# Altium footprint library LUMI_Handy_Soldering_LIB.PcbLib: 562 footprints (part 4 of 36)
Each footprint in its own frame and in the unit in brackets; x right, y up, seen from the top. Pads: shape width x height; smd on the part's side, far side on the other; paste and mask are expansions set on the pad; w line width, h text height; cw(c..) or ccw(c..) is an arc to the next point about the centre after c.
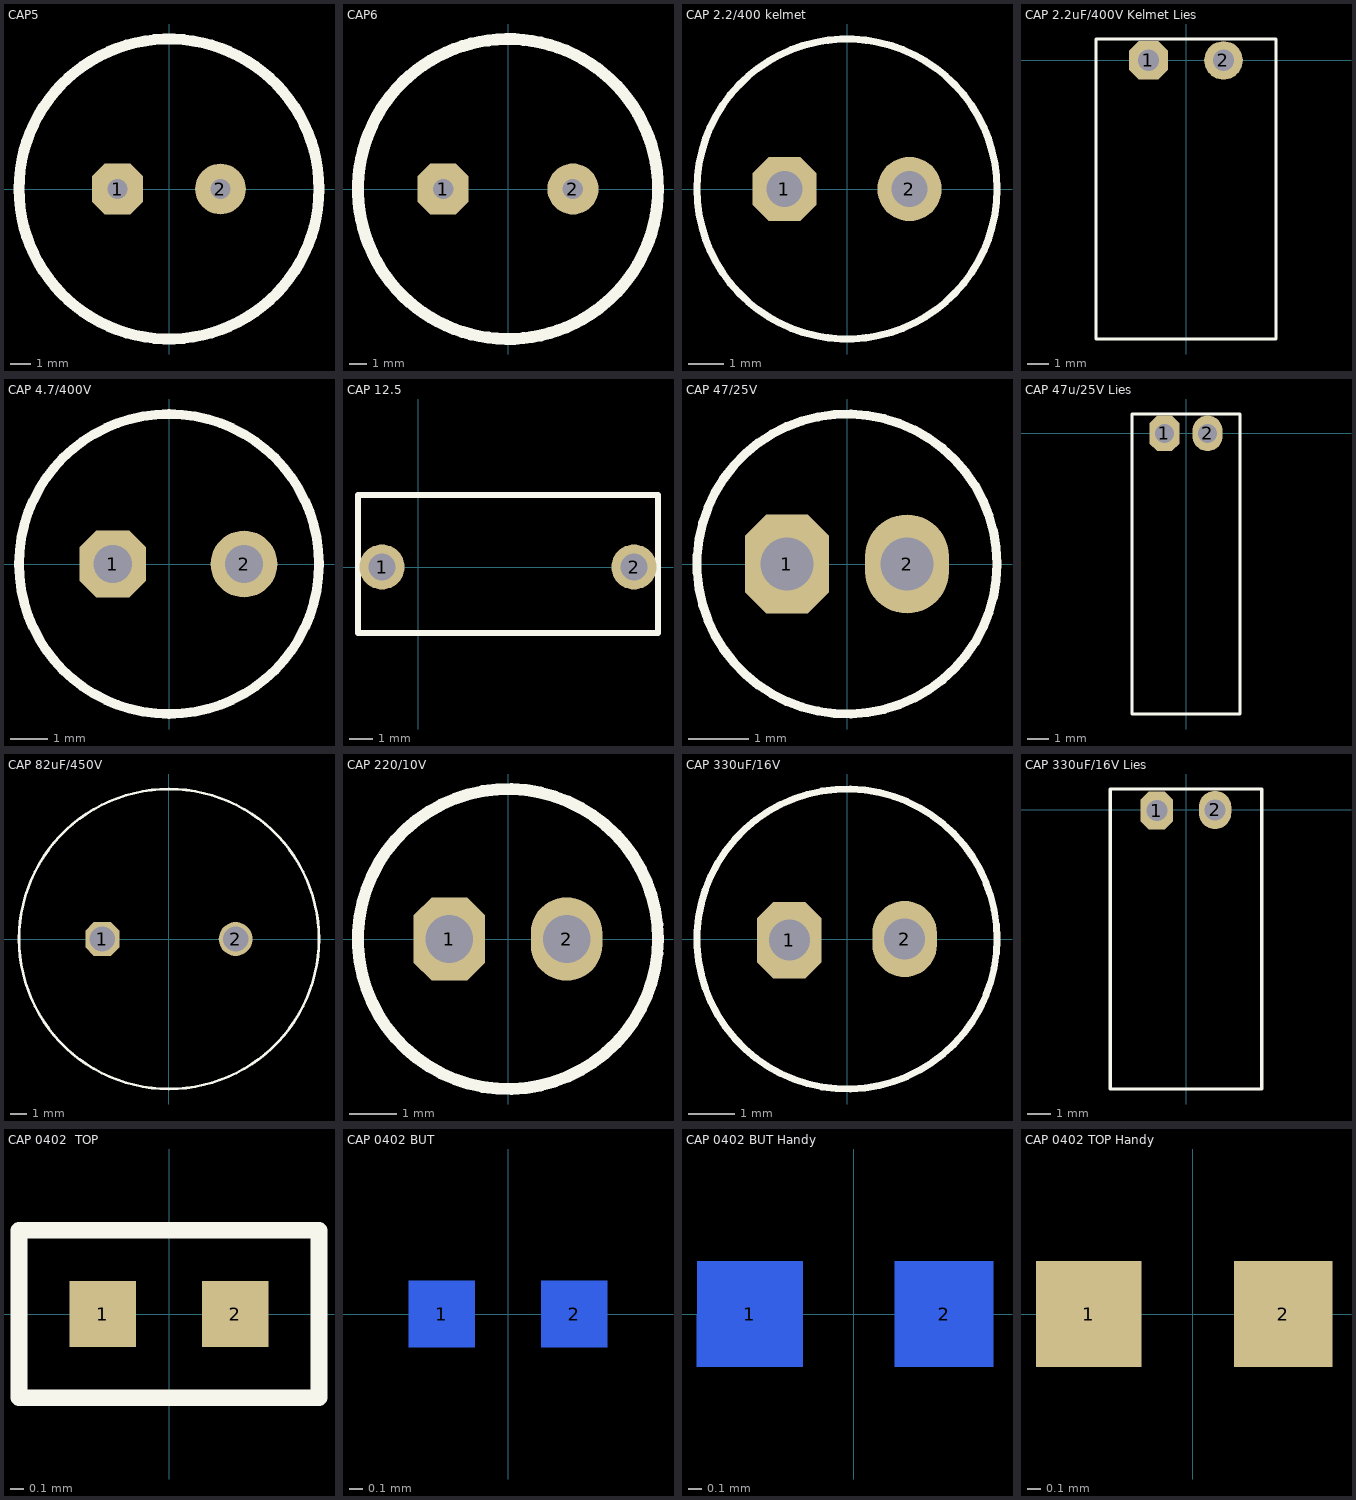
[diagram p3: the footprints below, top view; thin cyan lines are the x and y axes]

## CAP5 [mm]
pads (2):
  oct 2.5x2.5 hole 1: 1(-2.54,0)
  round 2.5 hole 1: 2(2.54,0)
Top Overlay:
  circle w0.54: c0,0 r7.4

## CAP6 [mm]
pads (2):
  oct 3x3 hole 1.2: 1(-3.81,0)
  round 3 hole 1.2: 2(3.81,0)
Top Overlay:
  circle w0.7: c0,0 r8.8

## CAP 2.2/400 kelmet [mm]
pads (2):
  oct 1.8x1.8 hole 1: 1(-1.75,0)
  round 1.8 hole 1: 2(1.75,0)
Top Overlay:
  circle w0.2: c0,0 r4.2
3D body: height 12.13, standoff -2.37, extent -3.996,-4 4.004,4

## CAP 2.2uF/400V Kelmet Lies [mm]
pads (2):
  oct 1.8x1.8 hole 1: 1(-1.75,0)
  round 1.8 hole 1: 2(1.75,0)
Top Overlay:
  lines w0.15: -4.2,-13 -4.2,1 4.2,1 4.2,-13 -4.2,-13
3D body: height 8, standoff 0, extent -4,-13.027 4,1.473

## CAP 4.7/400V [mil]
pads (2):
  oct 70x70 hole 40: 1(-59.06,0)
  round 70 hole 40: 2(78.74,0)
Top Overlay:
  circle w10: c0,0 r157.48
3D body: height 454.24, standoff -746.06, extent -157.48,-157.48 157.48,157.48

## CAP 12.5 [mil]
pads (2):
  round 75 hole 45: 1(-60,0) 2(360,0)
Top Overlay:
  lines w10: -100,-110 400,-110 400,120 -100,120 -100,-110
3D body: height 439.21, standoff -364.35, extent -96.06,-112.28 396.06,120

## CAP 47/25V [mil]
pads (2):
  oct 55x65 hole 35: 1(-39.37,0)
  oval 55x65 hole 35: 2(39.37,0)
Top Overlay:
  circle w5.91: c0,0 r98.43
3D body: height 29.82, standoff -471.19, extent -101.4,-102.04 103.54,100.48

## CAP 47u/25V Lies [mil]
pads (2):
  oct 55x65 hole 35: 1(-39.37,0)
  oval 55x65 hole 35: 2(39.37,0)
Top Overlay:
  lines w5.91: -98.43,-511.81 -98.43,35.43 98.43,35.43 98.43,-511.81 -98.43,-511.81
3D body: height -17.06, standoff -219.57, extent -102.58,-510.34 102.36,-9.34

## CAP 82uF/450V [mil]
pads (2):
  oct 80x80 hole 60: 1(-157.48,0)
  round 80 hole 60: 2(157.48,0)
Top Overlay:
  circle w6.06: c0,0 r354.33
3D body: height 1183.07, standoff -118.11, extent -356.29,-354.32 353.13,354.34

## CAP 220/10V [mil]
pads (2):
  oct 60x70 hole 40: 1(-49.21,0)
  oval 60x70 hole 40: 2(49.21,0)
Top Overlay:
  circle w10: c0,0 r125.98
3D body: height 437.01, standoff -744.09, extent -125.98,-125.98 122.05,122.05

## CAP 330uF/16V [mil]
pads (2):
  oct 55x65 hole 35: 1(-49.21,-0.99)
  oval 55x65 hole 35: 2(49.21,0)
Top Overlay:
  circle w5.91: c0,0 r127.95
3D body: height 29.82, standoff -471.19, extent -101.4,-102.04 103.54,100.48

## CAP 330uF/16V Lies [mil]
pads (2):
  oct 55x65 hole 35: 1(-49.21,-0.99)
  oval 55x65 hole 35: 2(49.21,0)
Top Overlay:
  lines w5.91: -127.95,-472.44 127.95,-472.44 127.95,35.43 -127.95,35.43 -127.95,-472.44
3D body: height -17.06, standoff -219.57, extent -102.58,-470.97 102.36,30.03
3D body: height 235.99, standoff 0.23, extent -117.18,-472.44 118.11,0

## CAP 0402  TOP [mm]
pads (2):
  rect 0.5x0.5 smd: 1(-0.5,0) 2(0.5,0)
Top Overlay:
  lines w0.127: -1.131,-0.631 -1.131,0.25 -1.131,0.631 1.131,0.631 1.131,0.25 1.131,-0.25 1.131,-0.631 -0.75,-0.631 -1.131,-0.631
3D body: height 0.2, standoff 0, extent -0.55,-0.3 0.45,0.3

## CAP 0402 BUT [mm]
pads (2):
  rect 0.5x0.5 smd far side: 1(-0.5,0) 2(0.5,0)
Bottom Overlay:
  lines w0.127: -1.131,-0.631 -1.131,-0.25 -1.131,0.25 -1.131,0.631 1.131,0.631 1.131,0.25 1.131,-0.631 0.75,-0.631 -1.131,-0.631
3D body: height 0.2, standoff 0, extent -0.45,-0.3 0.55,0.3

## CAP 0402 BUT Handy [mil]
pads (2):
  rect 30x30 smd far side: 1(-29.53,0)
  rect 28x30 smd far side: 2(25.59,0)
3D body: height -16.5, standoff -48, extent -33.46,-15.74 29.54,15.75

## CAP 0402 TOP Handy [mil]
pads (2):
  rect 30x30 smd: 1(-29.53,0)
  rect 28x30 smd: 2(25.59,0)
3D body: height 31.5, standoff 0, extent -33.46,-15.74 29.54,15.75